# Altium footprint library TE0706.PcbLib: 46 footprints (part 3 of 3)
Each footprint in its own frame and in the unit in brackets; x right, y up, seen from the top. Pads: shape width x height; smd on the part's side, far side on the other; paste and mask are expansions set on the pad; w line width, h text height; cw(c..) or ccw(c..) is an arc to the next point about the centre after c.
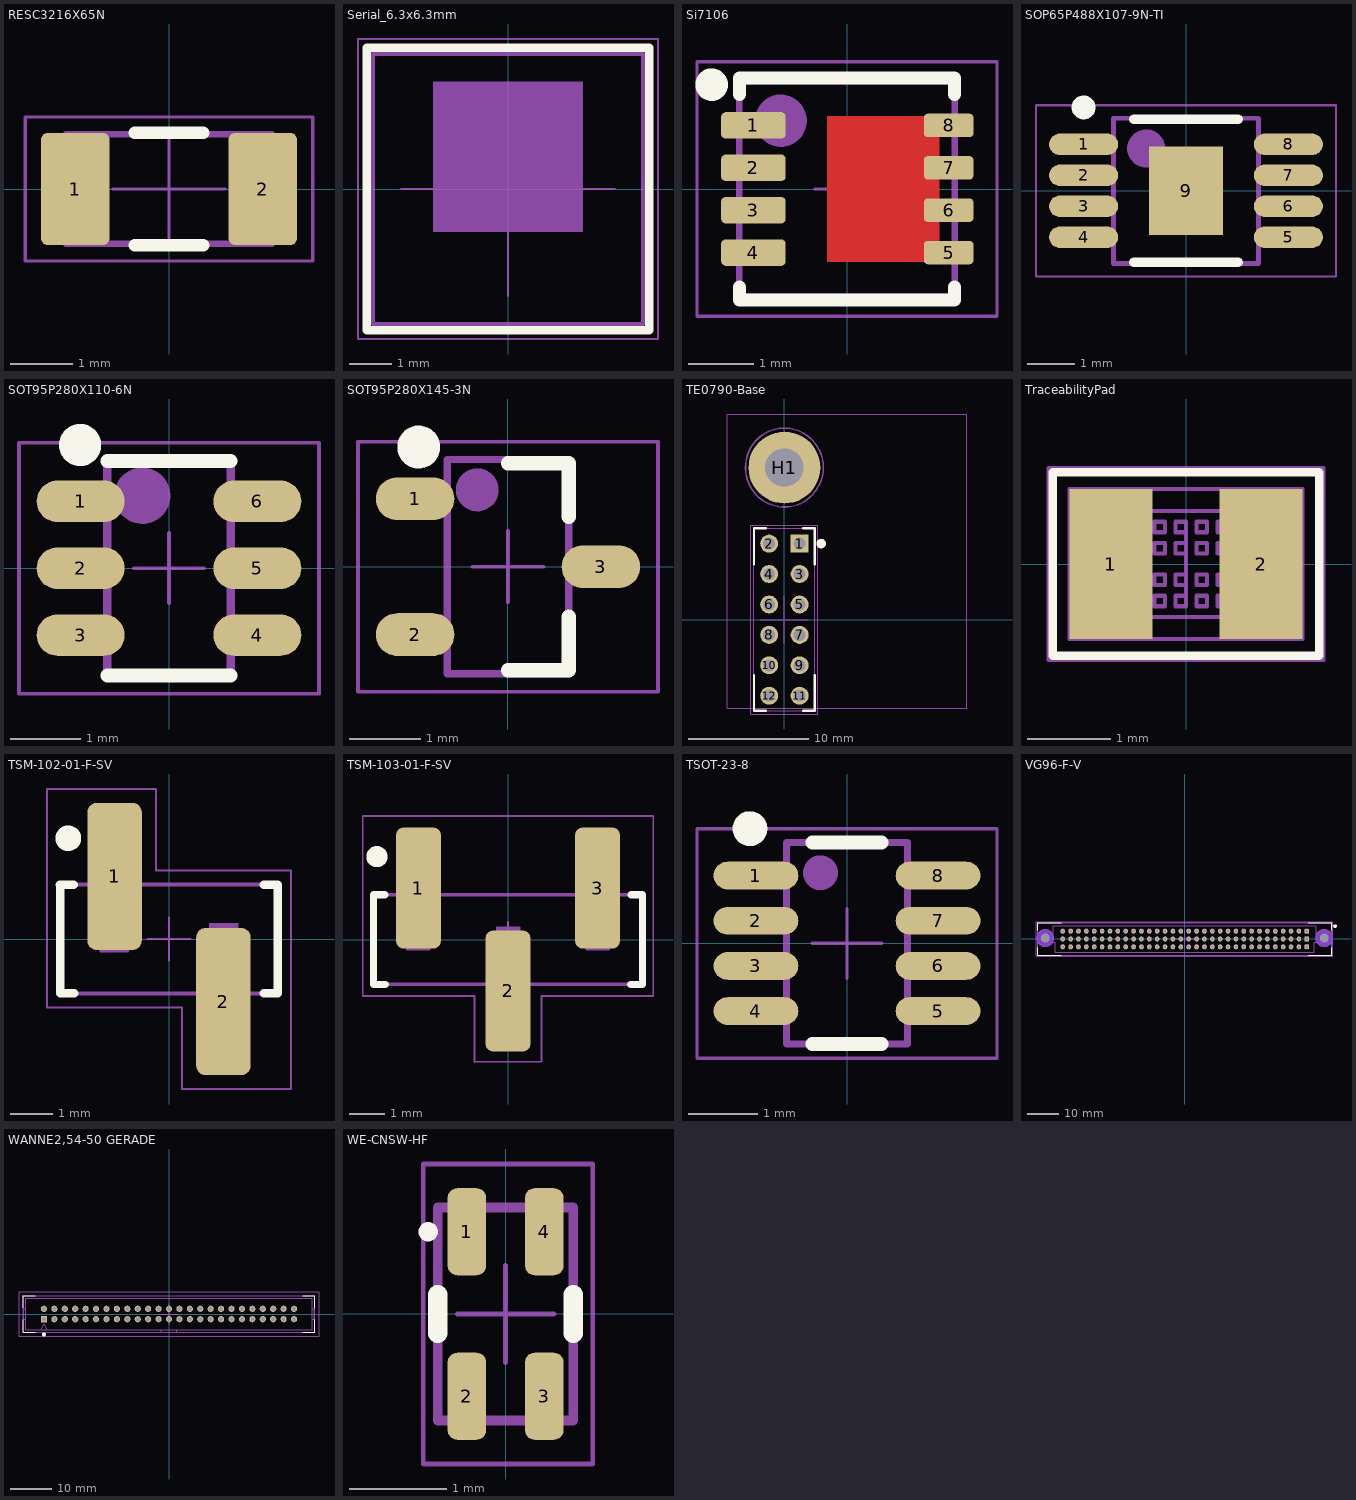
[diagram p2: the footprints below, top view; thin cyan lines are the x and y axes]

## RESC3216X65N [mm] "Vishay D1206 3.2 x 1.6 (+/- 0.15), 0.2mm - 0.6mm Kontakte"
height 0.65
pads (2):
  rrect20% 1.1x1.8 smd: 1(-1.5,0) 2(1.5,0)
Top Overlay:
  lines w0.2: -0.55,-0.9 0.55,-0.9 ; -0.55,0.9 0.55,0.9
Mechanical 13:
  lines w0.1: -1.1,-0.875 -1.1,0.875 ; 1.1,-0.875 1.1,0.875 ; -1.65,-0.875 -1.65,0.875 1.65,0.875 1.65,-0.875 0,-0.875 -1.65,-0.875
  text ".Designator" at -1.5,1 h1
Mechanical 15:
  lines w0.05: -0.9,0 0,0 ; 0,-0.9 0,0 ; 0,0.9 0,0 ; 0.9,0 0,0 ; -2.3,-1.15 -2.3,1.15 2.3,1.15 2.3,-1.15 0,-1.15 -2.3,-1.15
3D body "RESC3216X06N.STEP": height 0.55, standoff 0, extent -1.6,-0.8 1.6,0.8

## Serial_6.3x6.3mm [mm]
Top Overlay:
  lines w0.2: -3.3,-3.3 -3.3,3.3 3.3,3.3 3.3,-3.3 -3.3,-3.3
Mechanical 13:
  region: -1.75,2.5 -1.75,-1 1.75,-1 1.75,2.5
  lines w0.1: -3.15,-3.15 3.15,-3.15 3.15,3.15 -3.15,3.15 -3.15,-3.15
  text "SerialNr" at -2.5,-2.5 h0.7
Mechanical 15:
  lines w0.05: -2.5,0 2.5,0 ; 0,-2.5 0,2.5 ; -3.5,-3.5 -3.5,3.5 3.5,3.5 3.5,-3.5 -3.5,-3.5
3D body "Label.STEP": height 0.21, standoff 0, extent -3,-3 3,3

## Si7106 [mm] "Small Outline No-Lead (SON), 0.65 mm pitch; 8 pin, 3.30 mm L X 3.30 mm W X 1.12 mm H body"
height 1.12
pads (8):
  rrect33% 0.99x0.405 smd: 1(-1.435,0.975) 2(-1.435,0.325) 3(-1.435,-0.325) 4(-1.435,-0.975)
  rrect33% 0.76x0.36 smd: 5(1.56,-0.975) 6(1.56,-0.325) 7(1.56,0.325) 8(1.56,0.975)
Top Layer:
  rectangle: -0.305,-1.12 1.419,1.12
Top Overlay:
  circle w0.25: c-2.075,1.6 r0.125
  lines w0.2: -1.65,-1.5 -1.65,-1.7 1.65,-1.7 1.65,-1.5 ; -1.65,1.45 -1.65,1.7 1.65,1.7 1.65,1.45
Mechanical 13:
  circle w0.4: c-1.015,1.047 r0.2
  lines w0.1: -1.65,-1.65 1.65,-1.65 1.65,1.65 -1.65,1.65 -1.65,-1.65
  text ".Designator" at 0.655,-0.655 h1
Mechanical 15:
  lines w0.05: -0.5,0 0.5,0 ; 0,-0.5 0,0.5 ; -2.3,-1.95 2.3,-1.95 2.3,1.95 -2.3,1.95 -2.3,-1.95
3D body "SON65P330X330X112-8.STEP": height 1.12, standoff 0, extent -1.7,-1.65 1.7,1.65

## SOP65P488X107-9N-TI [mm] "SOP, 8-Leads, Body 3,0x3,0mm (max), Pitch 0,65mm, IPC Medium Density"
height 1.1
pads (9):
  oval 1.45x0.45 smd: 1(-2.15,0.975) 2(-2.15,0.325) 3(-2.15,-0.325) 4(-2.15,-0.975) 5(2.15,-0.975) 6(2.15,-0.325) 7(2.15,0.325) 8(2.15,0.975)
  rect 1.55x1.85 smd: 9(0,0)
Top Overlay:
  circle w0.25: c-2.15,1.75 r0.125
  lines w0.2: -1.1,-1.5 1.1,-1.5 ; -1.1,1.5 1.1,1.5
Mechanical 13:
  circle w0.4: c-0.835,0.889 r0.2
  lines w0.1: -1.525,-1.525 1.525,-1.525 1.525,1.525 -1.525,1.525 -1.525,-1.525
  text ".Designator" at 0.836,0.103 h1
Mechanical 15:
  lines w0.05: -0.5,0 0.5,0 ; 0,-0.5 0,0.5 ; -3.15,-1.8 3.15,-1.8 3.15,1.8 -3.15,1.8 -3.15,-1.8
3D body "User Library-msop-8.STEP": height 1.15, standoff 0, extent -2.45,-1.5 2.45,1.5

## SOT95P280X110-6N [mm]
height 1.1
pads (6):
  oval 1.25x0.59 smd: 1(-1.255,0.95) 2(-1.255,0) 3(-1.255,-0.95) 4(1.255,-0.95) 5(1.255,0) 6(1.255,0.95)
Top Overlay:
  circle w0.3: c-1.262,1.75 r0.15
  lines w0.2: -0.875,-1.525 0.874,-1.525 ; -0.874,1.525 0.875,1.525
Mechanical 13:
  circle w0.4: c-0.38,1.03 r0.2
  lines w0.12: -0.88,-1.53 0.88,-1.53 0.88,1.53 -0.88,1.53 -0.88,-1.53
  text ".Designator" at -0.476,0.366 h1
Mechanical 15:
  lines w0.05: -0.5,0 0.5,0 ; 0,-0.5 0,0.5 ; -2.13,-1.78 2.13,-1.78 2.13,1.78 -2.13,1.78 -2.13,-1.78
3D body "SOP95P275X110-6L40.STEP": height 1.1, standoff 0, extent -1.375,-1.45 1.375,1.45

## SOT95P280X145-3N [mm] "SOT23, 3-Leads, Body 3,0x3,0mm (max), Pitch 0,95mm, IPC Medium Density"
height 1.45
pads (3):
  oval 1.1x0.6 smd: 1(-1.3,0.95) 2(-1.3,-0.95) 3(1.3,0)
Top Overlay:
  circle w0.3: c-1.25,1.675 r0.15
  lines w0.2: 0,-1.45 0.85,-1.45 0.85,-0.7 ; 0,1.45 0.85,1.45 0.85,0.7
Mechanical 13:
  circle w0.3: c-0.43,1.075 r0.15
  lines w0.05: -0.85,-1.15 -1.675,-1.15 -1.675,-0.75 -0.85,-0.75 ; -0.85,0.75 -1.675,0.75 -1.675,1.15 -0.85,1.15 ; 0.85,-0.2 1.675,-0.2 1.675,0.2 0.85,0.2
  lines w0.1: -0.85,-1.5 0.85,-1.5 0.85,1.5 -0.85,1.5 -0.85,-1.5
  text ".Designator" at 0.5,-1.14 h1
Mechanical 15:
  lines w0.05: -0.5,0 0.5,0 ; 0,-0.5 0,0.5 ; -2.1,-1.75 2.1,-1.75 2.1,1.75 -2.1,1.75 -2.1,-1.75
3D body "SW3dPS-3-lead sot23-3.STEP": height 1.01, standoff -0.01, extent -1.25,-1.46 1.226,1.46

## TE0790-Base [mm]
height 15
pads (13):
  rect 1.5x1.5 hole 1: 1(1.27,6.35)
  round 1.5 hole 1: 2(-1.27,6.35) 3(1.27,3.81) 4(-1.27,3.81) 5(1.27,1.27) 6(-1.27,1.27) 7(1.27,-1.27) 8(-1.27,-1.27) 9(1.27,-3.81) 10(-1.27,-3.81) 11(1.27,-6.35) 12(-1.27,-6.35)
  round 6 hole 3.2: H1(0,12.7)
Top Overlay:
  circle w0.4: c3.07,6.35 r0.2
  lines w0.2: -2.54,-4.62 -2.54,-7.62 -1.56,-7.62 ; -2.54,4.62 -2.54,7.62 -1.56,7.62 ; 1.56,-7.62 2.54,-7.62 2.54,-4.62 ; 1.56,7.62 2.54,7.62 2.54,4.62
Mechanical 11:
  lines w0.1: -4.78,-7.38 15.24,-7.38 15.24,17.174 -4.78,17.174 -4.78,-7.38
Mechanical 13:
  circle w0.1: c0,12.7 r1.6
  circle w0.1: c0,12.7 r3.25
  lines w0.1: -2.54,-7.62 2.54,-7.62 2.54,7.62 -2.54,7.62 -2.54,-7.62
  text "11" at 1,-5.23 h1
  text "12" at -2,-5.23 h1
  text "2" at -2,6.73 h1
  text "1" at 1,6.73 h1
  text ".Designator" at 0.3,-1.01 h1
Mechanical 14:
  circle w0.1: c0,12.7 r3.25
  circle w0.1: c0,12.7 r1.6
Mechanical 15:
  circle w0.05: c0,12.7 r3.3
  lines w0.05: -2,0 2,0 ; -1,12.7 1,12.7 ; 0,-2 0,2 ; 0,11.7 0,13.7 ; -2.8,-7.88 2.8,-7.88 2.8,7.88 -2.8,7.88 -2.8,-7.88
Mechanical 16:
  circle w0.05: c0,12.7 r3.3
3D body "female_header_a-bl254-dg-g12d.stp": height 8.5, standoff -3.2, extent -2.5,-7.745 2.5,7.745
3D body "TE0790-01.step": height 14.23, standoff 2.57, extent -4.78,-7.62 15.24,18.697

## TraceabilityPad [mm]
pads (2):
  rect 1x1.8 smd: 1(-0.9,0) 2(0.9,0)
Top Overlay:
  lines w0.1: -1.6,-1.1 1.6,-1.1 1.6,1.1 -1.6,1.1 -1.6,-1.1
Mechanical 13:
  drawing of 156 lines, arcs and shapes, not listed
  text ".Designator" at -1.4,-2 h1
Mechanical 15:
  lines w0.05: 0,-0.5 0,0.5 ; -1.65,-1.15 1.65,-1.15 1.65,1.15 -1.65,1.15 -1.65,-1.15
3D body "916580020.stp": height 0.3, standoff 0, extent -1.4,-0.9 1.4,0.9

## TSM-102-01-F-SV [mm]
height 9.65
pads (2):
  rrect33% 1.27x3.43 smd: 1(-1.27,1.46) 2(1.27,-1.46)
Top Overlay:
  circle w0.3: c-2.35,2.35 r0.15
  lines w0.2: -2.55,1.27 -2.22,1.27 ; -2.54,1.27 -2.54,-1.27 -2.21,-1.27 ; 2.21,-1.27 2.54,-1.27 2.54,1.27 2.21,1.27
Mechanical 13:
  region: 1.579,0.33 0.979,0.33 0.979,-0.27 1.579,-0.27
  rectangle: -1.581,-0.27 -0.981,0.33
  lines w0.05: -1.6,-0.29 -0.96,-0.29 -0.96,0.35 -1.6,0.35 -1.6,-0.29 ; 0.96,-0.29 0.96,0.35 1.6,0.35 1.6,-0.29 0.96,-0.29
  lines w0.1: -2.55,-1.27 2.54,-1.27 2.54,1.27 -2.55,1.27 ; -2.54,-1.27 -2.54,1.27 ; -1.585,1.27 -1.585,2.63 -0.945,2.63 -0.945,1.27 ; 0.945,-1.27 0.945,-2.63 1.585,-2.63 1.585,-1.27
  text "1" at -2.15,1.65 h0.7
  text "2" at 1.85,-2.35 h0.7
  text ".Designator" at -0.3,1.55 h1
Mechanical 15:
  lines w0.05: -0.5,0 0.5,0 ; 0,-0.5 0,0.5 ; -2.85,-1.6 0.3,-1.6 0.3,-3.5 2.85,-3.5 2.85,1.6 -0.3,1.6 -0.3,3.5 -2.85,3.5 -2.85,-1.6
3D body "TSM-102-01-F-SV.stp": height 9.68, standoff 0.03, extent -2.54,-2.642 2.54,2.641
3D body "PP_Pad.step": height 11.45, standoff 4.59, extent -5.08,-2.007 5.08,2.007

## TSM-103-01-F-SV [mm]
height 9.65
pads (3):
  rrect33% 1.27x3.43 smd: 1(-2.54,1.46) 2(0,-1.46) 3(2.54,1.46)
Top Overlay:
  circle w0.3: c-3.72,2.35 r0.15
  lines w0.2: -3.49,1.27 -3.81,1.27 -3.81,-1.27 -3.48,-1.27 ; 3.48,-1.27 3.81,-1.27 3.81,1.27 3.49,1.27
Mechanical 13:
  region: 2.85,0.33 2.25,0.33 2.25,-0.27 2.85,-0.27
  rectangle: -2.85,-0.27 -2.25,0.33
  region: 0.31,0.33 -0.29,0.33 -0.29,-0.27 0.31,-0.27
  lines w0.05: -2.87,-0.29 -2.87,0.35 -2.23,0.35 -2.23,-0.29 -2.87,-0.29 ; -0.31,-0.29 0.33,-0.29 0.33,0.35 -0.31,0.35 -0.31,-0.29 ; 2.23,-0.29 2.87,-0.29 2.87,0.35 2.23,0.35 2.23,-0.29
  lines w0.1: -2.855,1.27 -2.855,2.63 -2.215,2.63 -2.215,1.27 ; -0.325,-1.27 -0.325,-2.63 0.315,-2.63 0.315,-1.27 ; 2.215,1.27 2.215,2.63 2.855,2.63 2.855,1.27 ; -3.81,-1.27 3.81,-1.27 3.81,1.27 -3.81,1.27 -3.81,-1.27
  text "3" at 3.25,1.65 h0.7
  text "1" at -3.4,1.65 h0.7
  text ".Designator" at 3.368,-1.441 h1
Mechanical 15:
  lines w0.05: -0.5,0 0.5,0 ; 0,-0.5 0,0.5 ; -4.12,-1.6 -0.95,-1.6 -0.95,-3.471 0.95,-3.471 0.95,-1.6 4.12,-1.6 4.12,3.5 -4.12,3.5 -4.12,-1.6
3D body "PP_Pad.step": height 11.45, standoff 4.59, extent -5.08,-2.007 5.08,2.007
3D body "TSM-103-01-F-SV.stp": height 9.68, standoff 0.03, extent -3.82,-2.65 3.8,2.633

## TSOT-23-8 [mm]
height 1.75
pads (8):
  oval 1.22x0.4 smd: 1(-1.31,0.975) 2(-1.31,0.325) 3(-1.31,-0.325) 4(-1.31,-0.975) 5(1.31,-0.975) 6(1.31,-0.325) 7(1.31,0.325) 8(1.31,0.975)
Top Overlay:
  circle w0.25: c-1.397,1.651 r0.125
  lines w0.2: -0.5,-1.45 0.5,-1.45 ; -0.5,1.45 0.5,1.45
Mechanical 13:
  circle w0.3: c-0.381,1.016 r0.1
  lines w0.1: -0.87,-1.45 -0.87,1.45 0.87,1.45 0.87,-1.45 -0.87,-1.45
  text ".Designator" at -0.308,0.526 h0.7
Mechanical 15:
  lines w0.05: -0.5,0 0.5,0 ; 0,-0.5 0,0.5 ; -2.159,-1.651 -2.159,1.651 2.159,1.651 2.159,-1.651 -2.159,-1.651
3D body "User Library-TSOT-23-8.STEP": height 1, standoff 0, extent -1.4,-1.45 1.4,1.45
3D body: height 1.01, standoff 0, extent -0.579,0.816 -0.181,1.216

## VG96-F-V [mm]
height 11.1
pads (98):
  rect 1.5x1.5 hole 1: A1(39.37,2.54) B1(39.37,0) C1(39.37,-2.54)
  round 1.5 hole 1: A2(36.83,2.54) A3(34.29,2.54) A4(31.75,2.54) A5(29.21,2.54) A6(26.67,2.54) A7(24.13,2.54) A8(21.59,2.54) A9(19.05,2.54) A10(16.51,2.54) A11(13.97,2.54) A12(11.43,2.54) A13(8.89,2.54) A14(6.35,2.54) A15(3.81,2.54) A16(1.27,2.54) A17(-1.27,2.54) A18(-3.81,2.54) A19(-6.35,2.54) A20(-8.89,2.54) A21(-11.43,2.54) A22(-13.97,2.54) A23(-16.51,2.54) A24(-19.05,2.54) A25(-21.59,2.54) A26(-24.13,2.54) A27(-26.67,2.54) A28(-29.21,2.54) A29(-31.75,2.54) A30(-34.29,2.54) A31(-36.83,2.54) A32(-39.37,2.54) B2(36.83,0) B3(34.29,0) B4(31.75,0) B5(29.21,0) B6(26.67,0) B7(24.13,0) B8(21.59,0) B9(19.05,0) B10(16.51,0) B11(13.97,0) B12(11.43,0) B13(8.89,0) B14(6.35,0) B15(3.81,0) B16(1.27,0) B17(-1.27,0) B18(-3.81,0) B19(-6.35,0) B20(-8.89,0) B21(-11.43,0) B22(-13.97,0) B23(-16.51,0) B24(-19.05,0) B25(-21.59,0) B26(-24.13,0) B27(-26.67,0) B28(-29.21,0) B29(-31.75,0) B30(-34.29,0) B31(-36.83,0) B32(-39.37,0) C2(36.83,-2.54) C3(34.29,-2.54) C4(31.75,-2.54) C5(29.21,-2.54) C6(26.67,-2.54) C7(24.13,-2.54) C8(21.59,-2.54) C9(19.05,-2.54) C10(16.51,-2.54) C11(13.97,-2.54) C12(11.43,-2.54) C13(8.89,-2.54) C14(6.35,-2.54) C15(3.81,-2.54) C16(1.27,-2.54) C17(-1.27,-2.54) C18(-3.81,-2.54) C19(-6.35,-2.54) C20(-8.89,-2.54) C21(-11.43,-2.54) C22(-13.97,-2.54) C23(-16.51,-2.54) C24(-19.05,-2.54) C25(-21.59,-2.54) C26(-24.13,-2.54) C27(-26.67,-2.54) C28(-29.21,-2.54) C29(-31.75,-2.54) C30(-34.29,-2.54) C31(-36.83,-2.54) C32(-39.37,-2.54)
  round 0 hole 2.8 unplated: H1(45,0.3) H2(-45,0.3)
Bottom Layer keep-out:
  region: -45.16,3 -45.41,3 -45.901,2.902 -46.363,2.711 -46.779,2.433 -47.133,2.079 -47.411,1.663 -47.602,1.201 -47.7,0.71 -47.7,0.46 -47.7,0.14 -47.7,-0.11 -47.602,-0.601 -47.411,-1.063 -47.133,-1.479 -46.779,-1.833 -46.363,-2.111 -45.901,-2.302 -45.41,-2.4 -45.16,-2.4 -44.84,-2.4 -44.59,-2.4 -44.099,-2.302 -43.637,-2.111 -43.221,-1.833 -42.867,-1.479 -42.589,-1.063 -42.398,-0.601 -42.3,-0.11 -42.3,0.14 -42.3,0.46 -42.3,0.71 -42.398,1.201 -42.589,1.663 -42.867,2.079 -43.221,2.433 -43.637,2.711 -44.099,2.902 -44.59,3 -44.84,3
  region: 44.84,3 44.59,3 44.099,2.902 43.637,2.711 43.221,2.433 42.867,2.079 42.589,1.663 42.398,1.201 42.3,0.71 42.3,0.46 42.3,0.14 42.3,-0.11 42.398,-0.601 42.589,-1.063 42.867,-1.479 43.221,-1.833 43.637,-2.111 44.099,-2.302 44.59,-2.4 44.84,-2.4 45.16,-2.4 45.41,-2.4 45.901,-2.302 46.363,-2.111 46.779,-1.833 47.133,-1.479 47.411,-1.063 47.602,-0.601 47.7,-0.11 47.7,0.14 47.7,0.46 47.7,0.71 47.602,1.201 47.411,1.663 47.133,2.079 46.779,2.433 46.363,2.711 45.901,2.902 45.41,3 45.16,3
Top Overlay:
  circle w0.6: c48.5,4.15 r0.3
  lines w0.2: -47.5,-2.76 -47.5,-5.3 -39.88,-5.3 ; -47.5,2.76 -47.5,5.3 -39.88,5.3 ; 39.88,-5.3 47.5,-5.3 47.5,-2.76 ; 39.88,5.3 47.5,5.3 47.5,2.76
Bottom Overlay:
  circle w0.2: c45,0.3 r2.7
  circle w0.2: c-45,0.3 r2.7
Mechanical 13:
  circle w0.1: c-39.37,0 r0.6
  circle w0.1: c-36.83,0 r0.6
  circle w0.1: c-34.29,0 r0.6
  circle w0.1: c-31.75,0 r0.6
  circle w0.1: c-29.21,0 r0.6
  circle w0.1: c-26.67,0 r0.6
  circle w0.1: c-24.13,0 r0.6
  circle w0.1: c-21.59,0 r0.6
  circle w0.1: c-19.05,0 r0.6
  circle w0.1: c-16.51,0 r0.6
  circle w0.1: c-13.97,0 r0.6
  circle w0.1: c-11.43,0 r0.6
  circle w0.1: c-8.89,0 r0.6
  circle w0.1: c-6.35,0 r0.6
  circle w0.1: c-3.81,0 r0.6
  circle w0.1: c-1.27,0 r0.6
  circle w0.1: c1.27,0 r0.6
  circle w0.1: c3.81,0 r0.6
  circle w0.1: c6.35,0 r0.6
  circle w0.1: c8.89,0 r0.6
  circle w0.1: c11.43,0 r0.6
  circle w0.1: c13.97,0 r0.6
  circle w0.1: c16.51,0 r0.6
  circle w0.1: c19.05,0 r0.6
  circle w0.1: c21.59,0 r0.6
  circle w0.1: c24.13,0 r0.6
  circle w0.1: c26.67,0 r0.6
  circle w0.1: c29.21,0 r0.6
  circle w0.1: c31.75,0 r0.6
  circle w0.1: c34.29,0 r0.6
  circle w0.1: c36.83,0 r0.6
  circle w0.1: c39.37,0 r0.6
  circle w0.1: c-39.37,-2.54 r0.6
  circle w0.1: c-36.83,-2.54 r0.6
  circle w0.1: c-34.29,-2.54 r0.6
  circle w0.1: c-31.75,-2.54 r0.6
  circle w0.1: c-29.21,-2.54 r0.6
  circle w0.1: c-26.67,-2.54 r0.6
  circle w0.1: c-24.13,-2.54 r0.6
  circle w0.1: c-21.59,-2.54 r0.6
  circle w0.1: c-19.05,-2.54 r0.6
  circle w0.1: c-16.51,-2.54 r0.6
  circle w0.1: c-13.97,-2.54 r0.6
  circle w0.1: c-11.43,-2.54 r0.6
  circle w0.1: c-8.89,-2.54 r0.6
  circle w0.1: c-6.35,-2.54 r0.6
  circle w0.1: c-3.81,-2.54 r0.6
  circle w0.1: c-1.27,-2.54 r0.6
  circle w0.1: c1.27,-2.54 r0.6
  circle w0.1: c3.81,-2.54 r0.6
  circle w0.1: c6.35,-2.54 r0.6
  circle w0.1: c8.89,-2.54 r0.6
  circle w0.1: c11.43,-2.54 r0.6
  circle w0.1: c13.97,-2.54 r0.6
  circle w0.1: c16.51,-2.54 r0.6
  circle w0.1: c19.05,-2.54 r0.6
  circle w0.1: c21.59,-2.54 r0.6
  circle w0.1: c24.13,-2.54 r0.6
  circle w0.1: c26.67,-2.54 r0.6
  circle w0.1: c29.21,-2.54 r0.6
  circle w0.1: c31.75,-2.54 r0.6
  circle w0.1: c34.29,-2.54 r0.6
  circle w0.1: c36.83,-2.54 r0.6
  circle w0.1: c39.37,-2.54 r0.6
  circle w0.1: c39.37,2.54 r0.6
  circle w0.1: c36.83,2.54 r0.6
  circle w0.1: c34.29,2.54 r0.6
  circle w0.1: c31.75,2.54 r0.6
  circle w0.1: c29.21,2.54 r0.6
  circle w0.1: c26.67,2.54 r0.6
  circle w0.1: c24.13,2.54 r0.6
  circle w0.1: c21.59,2.54 r0.6
  circle w0.1: c19.05,2.54 r0.6
  circle w0.1: c16.51,2.54 r0.6
  circle w0.1: c13.97,2.54 r0.6
  circle w0.1: c11.43,2.54 r0.6
  circle w0.1: c8.89,2.54 r0.6
  circle w0.1: c6.35,2.54 r0.6
  circle w0.1: c3.81,2.54 r0.6
  circle w0.1: c1.27,2.54 r0.6
  circle w0.1: c-1.27,2.54 r0.6
  circle w0.1: c-3.81,2.54 r0.6
  circle w0.1: c-6.35,2.54 r0.6
  circle w0.1: c-8.89,2.54 r0.6
  circle w0.1: c-11.43,2.54 r0.6
  circle w0.1: c-13.97,2.54 r0.6
  circle w0.1: c-16.51,2.54 r0.6
  circle w0.1: c-19.05,2.54 r0.6
  circle w0.1: c-21.59,2.54 r0.6
  circle w0.1: c-24.13,2.54 r0.6
  circle w0.1: c-26.67,2.54 r0.6
  circle w0.1: c-29.21,2.54 r0.6
  circle w0.1: c-31.75,2.54 r0.6
  circle w0.1: c-34.29,2.54 r0.6
  circle w0.1: c-36.83,2.54 r0.6
  circle w0.1: c-39.37,2.54 r0.6
  circle w0.1: c-45,0.3 r1.35
  circle w0.1: c45,0.3 r1.35
  lines w0.1: -47.5,-5.3 -47.5,5.3 47.5,5.3 47.5,-5.3 -47.5,-5.3 ; -42.5,-1 -42.5,4.25 42.5,4.25 42.5,-1 41.8,-1 41.8,-4.25 -41.8,-4.25 -41.8,-1 -42.5,-1
  text "B" at -42.055,0.465 h1.52
  text "B" at 40.46,0.66 h1.52
  text ".Designator" at 45.5,5 h1
  text "A" at -44.4,3.2 h1.52
  text "C" at -44.4,-2 h1.52
  text "A" at 43,3.2 h1.52
  text "C" at 43,-2 h1.52
  text "1" at 39.2,-7.2 h1.52
  text "32" at -40.6,-7.2 h1.52
Mechanical 15:
  lines w0.05: -3,0 3,0 ; 0,-3 0,3 ; -47.99,-5.55 -47.99,5.55 47.75,5.55 47.75,-5.55 -47.99,-5.55
Mechanical 16:
  circle w0.05: c-45,0.3 r2.7
  circle w0.05: c45,0.3 r2.7
3D body "User Library-DIN41612-C-96-F.STEP": height 11.7, standoff -4.72, extent -47.45,-5.3 47.45,5.3

## WANNE2,54-50 GERADE [mm]
height 9.5
pads (50):
  rect 1.5x1.5 hole 1: 1(-30.48,-1.27)
  round 1.5 hole 1: 2(-30.48,1.27) 3(-27.94,-1.27) 4(-27.94,1.27) 5(-25.4,-1.27) 6(-25.4,1.27) 7(-22.86,-1.27) 8(-22.86,1.27) 9(-20.32,-1.27) 10(-20.32,1.27) 11(-17.78,-1.27) 12(-17.78,1.27) 13(-15.24,-1.27) 14(-15.24,1.27) 15(-12.7,-1.27) 16(-12.7,1.27) 17(-10.16,-1.27) 18(-10.16,1.27) 19(-7.62,-1.27) 20(-7.62,1.27) 21(-5.08,-1.27) 22(-5.08,1.27) 23(-2.54,-1.27) 24(-2.54,1.27) 25(0,-1.27) 26(0,1.27) 27(2.54,-1.27) 28(2.54,1.27) 29(5.08,-1.27) 30(5.08,1.27) 31(7.62,-1.27) 32(7.62,1.27) 33(10.16,-1.27) 34(10.16,1.27) 35(12.7,-1.27) 36(12.7,1.27) 37(15.24,-1.27) 38(15.24,1.27) 39(17.78,-1.27) 40(17.78,1.27) 41(20.32,-1.27) 42(20.32,1.27) 43(22.86,-1.27) 44(22.86,1.27) 45(25.4,-1.27) 46(25.4,1.27) 47(27.94,-1.27) 48(27.94,1.27) 49(30.48,-1.27) 50(30.48,1.27)
Top Overlay:
  circle w0.5: c-30.49,-5 r0.25
  lines w0.2: -35.56,-1.445 -35.56,-4.445 -32.56,-4.445 ; -35.56,1.555 -35.56,4.445 -32.56,4.445 ; 32.56,-4.445 35.56,-4.445 35.56,-1.445 ; 32.56,4.445 35.56,4.445 35.56,1.445
Mechanical 13:
  lines w0.2: -35.56,-1.27 -34.925,-1.27 ; -35.56,1.27 -34.925,1.27 ; -35.348,-1.27 -35.348,1.27 ; -31.115,-3.81 -30.48,-2.54 -29.845,-3.81 ; -1.905,-4.445 -1.905,-3.81 1.905,-3.81 1.905,-4.445 ; 34.925,-1.27 35.56,-1.27 ; 34.925,1.27 35.56,1.27 ; 35.348,-1.27 35.348,1.27 ; -35.56,-4.445 -35.56,4.445 35.56,4.445 35.56,-4.445 -35.56,-4.445 ; -34.925,-3.81 -34.925,3.81 34.925,3.81 34.925,-3.81 -17.145,-3.81 -34.925,-3.81
  text ".Designator" at -1,-1 h2
  text "2" at -32.68,0.52 h1.5
  text "1" at -32.18,-2.02 h1.5
  text "50" at 31.68,0.52 h1.5
  text "49" at 31.68,-2.02 h1.5
Mechanical 15:
  lines w0.05: -2.54,0 2.54,0 ; 0,-2.54 0,2.54 ; -36.56,-5.445 36.56,-5.445 36.56,5.445 -36.56,5.445 -36.56,-5.445
3D body "50-09185506329.stp": height 9.5, standoff -5.4, extent -35.66,-4.45 35.66,4.75

## WE-CNSW-HF [mm]
height 1.4
pads (4):
  rrect50% 0.4x0.9 smd: 1(-0.4,0.85) 2(-0.4,-0.85) 3(0.4,-0.85) 4(0.4,0.85)
Top Overlay:
  circle w0.1: c-0.8,0.85 r0.05
  lines w0.2: -0.7,-0.2 -0.7,0.2 ; 0.7,-0.2 0.7,0.2
Mechanical 13:
  lines w0.1: -0.7,-1.1 0.7,-1.1 0.7,1.1 -0.7,1.1 -0.7,-1.1
  text ".Designator" at -0.893,-0.762 h1
Mechanical 15:
  lines w0.05: -0.5,0 0.5,0 ; 0,-0.5 0,0.5 ; -0.85,-1.55 0.9,-1.55 0.9,1.55 -0.85,1.55 -0.85,-1.55
3D body "WE-CNSW_HF_0805_CNSWHF.stp": height 1.19, standoff -0.01, extent -0.6,-1 0.6,1